# Altium integrated library Transistor-SMD_V2.IntLib: 415 symbols (part 2 of 2) (continued)
## NTGS4141N _TSOP6-X (continued)

## NTHD4508N_ChipFET8
designator Q?, comment NTHD4508N
FET Dual N-Channel 4.1A 20V; Manufacturer: On Semi; Package: ChipFET-8-1.7x3; EDM-PN: *; Text2: *; Text1: *; Value: NTHD4508N; SAAB PN: *; Part Number: NTHD4508N; DCE Part No: *
footprint ChipFET-8-1.7x3 (ChipFET 8 1.7x3.0mm)
part A pins: 1 S1, 2 G1, 7 D1, 8 D2
part B pins: 3 S2, 4 G2, 5 D2, 6 D2
part A text: D; G; S
part B text: D; G; S

## NTJD4152PT1G_SC88
designator Q?, comment NTJD4152PT1G
FET Dual P-Channel 0.88A 20V; Manufacturer: On Semi; Package: SC88-6; EDM-PN: *; Text2: *; Text1: *; Value: NTJD4152PT1G; SAAB PN: *; Part Number: NTJD4152PT1G; DCE Part No: *
footprint SC88-6 (SC88-6 1.35x2.2mm 6lead)
part A pins: 1 S1, 2 G1, 6 D1
part B pins: 3 D2, 4 S2, 5 G2
part A text: D; G; S
part B text: D; G; S

## NTLUS3A40PZ_UDFN6
designator Q?, comment NTLUS3A40PZ
FET P-Channel 9.4A 20V; Manufacturer: On Semi; Package: SO8; EDM-PN: *; Text2: *; Text1: *; Value: NTLUS3A40PZ; SAAB PN: *; Part Number: NTLUS3A40PZ; DCE Part No: *
footprint UDFN6-2x2-2EP (UDFN 6 2x2mm)
pins: 1 D, 2 D, 3 G, 4 S, 5 D, 6 D, 7 D, 8 S

## NTR4003NT1G_SOT23
designator Q?, comment NTR4003NT1G
FET N-Channel 500mA 30V; Manufacturer: On Semi; Package: SOT23; EDM-PN: *; Text2: *; Text1: *; Value: NTR4003NT1G; SAAB PN: *; Part Number: NTR4003NT1G; DCE Part No: *
footprint SOT23 (SOT23, 3-Leads, Body 3.0x1.4mm (max), Pitch 0.95mm, IPC Medium Density)
pins: 1 G, 2 S, 3 D

## NTR4003NT3G_SOT23
designator Q?, comment NTR4003NT3G
FET N-Channel 500mA 30V; Manufacturer: On Semi; Package: SOT23; EDM-PN: *; Text2: *; Text1: *; Value: NTR4003NT3G; SAAB PN: *; Part Number: NTR4003NT3G; DCE Part No: *
footprint SOT23 (SOT23, 3-Leads, Body 3.0x1.4mm (max), Pitch 0.95mm, IPC Medium Density)
pins: 1 G, 2 S, 3 D

## NTR5105PT1G_SOT23
designator Q?, comment NTR5105PT1G
FET P-Channel 60V 196mA; Manufacturer: On Semi; Package: SOT23; EDM-PN: *; Text2: *; Text1: *; Value: NTR5105PT1G; SAAB PN: *; DCE Part No: *; Part Number: NTR5105PT1G
footprint SOT23 (SOT23, 3-Leads, Body 3.0x1.4mm (max), Pitch 0.95mm, IPC Medium Density)
pins: 1 G, 2 S, 3 D

## NVTJD4001NT1G_SC70-6
designator Q?, comment NVTJD4001NT1G
FET N-Channel Dual  30V 250mA; Manufacturer: On Semi; Package: SC70-6; EDM-PN: *; Text2: *; Text1: *; Value: NVTJD4001NT1G; SAAB PN: *; DCE Part No: *; Part Number: NVTJD4001NT1G
footprint SC70-6 (SC70, 6-Leads, Body 2.2x1.4mm (max), Pitch 0.65mm, IPC Medium Density)
part A pins: 1 G, 2 S, 6 D
part B pins: 3 D, 4 S, 5 G

## NX2301P_SOT23
designator Q?, comment NX2301P
FET P-Channel 2A 20V; Manufacturer: NXP; Package: SOT23; EDM-PN: *; Text2: *; Text1: *; Value: NX2301P; SAAB PN: *; Part Number: NX2301P; DCE Part No: *
footprint SOT23 (SOT23, 3-Leads, Body 3.0x1.4mm (max), Pitch 0.95mm, IPC Medium Density)
pins: 1 G, 2 S, 3 D

## NX3008NBK_SOT23
designator Q?, comment NX3008NBK
FET N-Channel 400mA 30V Trench MOSFET; Manufacturer: NXP; Package: SOT23; EDM-PN: *; Text2: *; Text1: *; Value: NX3008NBK; Part Number: NX3008NBK; SAAB PN: *; DCE Part No: *
footprint SOT23 (SOT23, 3-Leads, Body 3.0x1.4mm (max), Pitch 0.95mm, IPC Medium Density)
pins: 1 G, 2 S, 3 D

## NYC0102BLT1G_SOT23_H
designator SCR?, comment NYC0102BLT1G
SCR 0.25Amp 200V; Manufacturer: Littelfuse; Package: SOT23; EDM-PN: *; Text2: *; Text1: *; Part Number: NYC0102BLT1G; SAAB PN: *; Value: NYC0102BLT1G; DCE Part No: *
footprint SOT23 (SOT23, 3-Leads, Body 3.0x1.4mm (max), Pitch 0.95mm, IPC Medium Density)
pins: 1 K, 2 G, 3 A

## NYC0102BLT1G_SOT23_V
designator SCR?, comment NYC0102BLT1G
SCR 0.25Amp 200V; Manufacturer: Littelfuse; Package: SOT23; EDM-PN: *; Text2: *; Text1: *; Part Number: NYC0102BLT1G; Value: NYC0102BLT1G; SAAB PN: *; DCE Part No: *
footprint SOT23 (SOT23, 3-Leads, Body 3.0x1.4mm (max), Pitch 0.95mm, IPC Medium Density)
pins: 1 K, 2 G, 3 A

## P0102BL 5AA4_SOT23_H
designator SCR?, comment value P0102BL  (hidden comment: P0102BL 5AA4)
SCR 0.25Amp 200V; Manufacturer: ST; Package: SOT23; EDM-PN: *; Text2: *; Text1: *; Part Number: P0102BL 5AA4; SAAB PN: *; DCE Part No: *
footprint SOT23 (SOT23, 3-Leads, Body 3.0x1.4mm (max), Pitch 0.95mm, IPC Medium Density)
pins: 1 K, 2 G, 3 A

## P0102BL 5AA4_SOT23_V
designator SCR?, comment value P0102BL  (hidden comment: P0102BL 5AA4)
SCR 0.25Amp 200V; Manufacturer: ST; Package: SOT23; EDM-PN: *; Text2: *; Text1: *; Part Number: P0102BL 5AA4; SAAB PN: *; DCE Part No: *
footprint SOT23 (SOT23, 3-Leads, Body 3.0x1.4mm (max), Pitch 0.95mm, IPC Medium Density)
pins: 1 K, 2 G, 3 A

## PBHV8560Z_SOT223
designator Q?, comment PBHV8560Z
Transistor NPN 600V 0.5A; Manufacturer: NXP; Package: SOT223; EDM-PN: *; Text2: *; Text1: *; Value: PBHV8560Z; SAAB PN: *; Part Number: PBHV8560Z; DCE Part No: *
footprint SOT223 (SOT223, 4-Leads, Body 6.7x7.3mm (max), Pitch 2.30mm, IPC Medium Density)
pins: 1 B, 2 C, 3 E, 4 C

## PBHV9050Z_SOT223
designator Q?, comment PBHV9050Z
Transistor PNP High Voltage 250mA 500V; Manufacturer: NXP; Package: SOT223; Text2: *; Text1: *; Value: PBHV9050Z; Part Number: PBHV9050Z; SAAB PN: *; DCE Part No: *
footprint SOT223 (SOT223, 4-Leads, Body 6.7x7.3mm (max), Pitch 2.30mm, IPC Medium Density)
pins: 1 G, 2 D, 3 S, 4 D
text: C; B; E

## PBHV9560Z_SOT223
designator Q?, comment PBHV9560Z
Transistor PNP High Voltage 600V 0.5A; Manufacturer: Nexperia; Package: SOT223; Text2: *; Text1: *; Value: PBHV9560Z; SAAB PN: *; Part Number: PBHV9560Z; DCE Part No: *
footprint SOT223 (SOT223, 4-Leads, Body 6.7x7.3mm (max), Pitch 2.30mm, IPC Medium Density)
pins: 1 G, 2 D, 3 S, 4 D
text: C; B; E

## PBHV9560ZX_SOT223
designator Q?, comment PBHV9560ZX
Transistor PNP High Voltage 600V 0.5A; Manufacturer: Nexperia; Package: SOT223; Text2: *; Text1: *; Value: PBHV9560ZX; SAAB PN: *; Part Number: PBHV9560ZX; DCE Part No: *
footprint SOT223 (SOT223, 4-Leads, Body 6.7x7.3mm (max), Pitch 2.30mm, IPC Medium Density)
pins: 1 G, 2 D, 3 S, 4 D
text: C; B; E

## PBSS8110T_SOT23-3N
designator Q?, comment PBSS8110T
Transistor NPN 1A 100V; Manufacturer: NXP; Reutech PN: 5961-NP-0059; Package: SOT23; EDM-PN: *; Text2: *; Text1: *; Value: PBSS8110T; SAAB PN: *; Part Number: PBSS8110T; DCE Part No: *
footprint SOT23 (SOT23, 3-Leads, Body 3.0x1.4mm (max), Pitch 0.95mm, IPC Medium Density)
pins: 1 B, 2 E, 3 C

## PD55003-E_PowerSO-10
designator Q?, comment PD55003-E
FET N-Channel RF Power Transistor; Manufacturer: ST; Package: SOT323; EDM-PN: *; Text2: *; Text1: *; Value: PD55003-E; SAAB PN: *; Part Number: PD55003-E; DCE Part No: *
footprint PowerSO-10RF-Formed (PowerSO-10RF Formed 15.4x9.5mm)
pins: 1 D, 2 S, 3 G

## PMBFJ177,215_SOT23
designator Q?, comment value PMBFJ177  (hidden comment: PMBFJ177,215)
FET P-Channel 50mA 20V; Manufacturer: NXP; Package: SOT23; EDM-PN: *; Text2: *; Text1: *; Part Number: PMBFJ177,215; SAAB PN: *; DCE Part No: *
footprint SOT23 (SOT23, 3-Leads, Body 3.0x1.4mm (max), Pitch 0.95mm, IPC Medium Density)
pins: 1 D, 2 S, 3 G

## PMBT2222_SOT23-3N
designator Q?, comment PMBT2222
Transistor NPN Switching; Manufacturer: Philips; Package: SOT23; EDM-PN: *; Text2: *; Text1: *; Value: PMBT2222; SAAB PN: *; Part Number: PMBT2222; DCE Part No: *
footprint SOT23 (SOT23, 3-Leads, Body 3.0x1.4mm (max), Pitch 0.95mm, IPC Medium Density)
pins: 1 B, 2 E, 3 C

## PMBT2222A_SOT23-3N
designator Q?, comment PMBT2222A
Transistor NPN Switching; Manufacturer: Philips; Package: SOT23; EDM-PN: *; Text2: *; Text1: *; Value: PMBT2222A; SAAB PN: *; Part Number: PMBT2222A; DCE Part No: *
footprint SOT23 (SOT23, 3-Leads, Body 3.0x1.4mm (max), Pitch 0.95mm, IPC Medium Density)
pins: 1 B, 2 E, 3 C

## PMBT2907A,215_SOT23
designator Q?, comment value PMBT2907A  (hidden comment: PMBT2907A,215)
Transistor PNP General Purpose 60V 600mA; Manufacturer: Nexperia; Package: SOT23; EDM-PN: *; Text2: *; Text1: *; SAAB PN: *; Part Number: PMBT2907A,215; DCE Part No: *
footprint SOT23 (SOT23, 3-Leads, Body 3.0x1.4mm (max), Pitch 0.95mm, IPC Medium Density)
pins: 1 B, 2 E, 3 C

## PMBT3904,215_SOT23
designator Q?, comment value PMBT3904  (hidden comment: PMBT3904,215)
Transistor NPN 40V 200mA; Manufacturer: Nexperia; Package: SOT23; EDM-PN: *; Text2: *; Text1: *; Part Number: PMBT3904,215; SAAB PN: *; DCE Part No: *
footprint SOT23 (SOT23, 3-Leads, Body 3.0x1.4mm (max), Pitch 0.95mm, IPC Medium Density)
pins: 1 B, 2 E, 3 C

## PMBTA45,215_SOT23
designator Q?, comment value PMBTA45  (hidden comment: PMBTA45,215PMBT3904,215)
Transistor NPN 500V 150mA; Manufacturer: Nexperia; Package: SOT23; EDM-PN: *; Text2: *; Text1: *; Part Number: PMBTA45,215; SAAB PN: *; DCE Part No: *
footprint SOT23 (SOT23, 3-Leads, Body 3.0x1.4mm (max), Pitch 0.95mm, IPC Medium Density)
pins: 1 B, 2 E, 3 C

## PMF280UN_SOT323
designator Q?, comment PMF280UN
FET N-Channel 1A 20V; Manufacturer: Philips; Package: SOT323; EDM-PN: *; Text2: *; Text1: *; Value: PMF280UN; SAAB PN: *; Part Number: PMF280UN; DCE Part No: *
footprint SOT323 (SOT323 2.2x1.3mm)
pins: 1 G, 2 S, 3 D

## PMF400UN_SOT323
designator Q?, comment PMF400UN
FET N-Channel 0.83A 30V; Manufacturer: Philips; Package: SOT323; EDM-PN: *; Text2: *; Text1: *; Value: PMF400UN; SAAB PN: *; Part Number: PMF400UN; DCE Part No: *
footprint SOT323 (SOT323 2.2x1.3mm)
pins: 1 G, 2 S, 3 D

## PMFPB8032XP,115_UDFN6
designator Q?, comment value PMFPB8032XP  (hidden comment: PMFPB8032XP,115)
FET P-Channel & Schottky Diode 20V 3.7A/320mA; Manufacturer: Nexperia; Package: DFN2020-6-EP2; EDM-PN: *; Text2: *; Text1: *; SAAB PN: *; Part Number: PMFPB8032XP,115; DCE Part No: *
footprint DFN2020-6-EP2 (DFN2020-6 2xE-PAD 2.0x2.0mm)
pins: 1 A, 2 NC, 3 D, 4 S, 5 G, 6 K, 7 K, 8 D

## PMGD780SN,115_SOT363
designator Q?, comment value PMGD780SN  (hidden comment: PMGD780SN,115)
FET Dual N-Channel 60V 490mA; Manufacturer: Nexperia; Package: SOT363-6; EDM-PN: *; Text2: *; Text1: *; Part Number: PMGD780SN,115; SAAB PN: *; DCE Part No: *
footprint SOT363-6 (SOT363 1.35x2.2mm 6lead)
part A pins: 1 S1, 2 G1, 6 D1
part B pins: 3 D2, 4 S2, 5 G2
part A text: D; G; S
part B text: D; G; S

## PMN22XN_TSOP6
designator Q?, comment PMN22XN
FET N-Channel 5.7A 30V; Manufacturer: NXP; Package: TSOP-6; EDM-PN: *; Text2: *; Text1: *; Value: PMN22XN; SAAB PN: *; Part Number: PMN22XN; DCE Part No: *
footprint TSOP-6 (SOT23, 6-Leads, Body 3.0x2.9mm (max), Pitch 0.95mm, IPC Medium Density)
pins: 1 D, 2 D, 3 G, 4 S, 5 D, 6 D

## PMN22XN_TSOP6-X
designator Q?, comment PMN22XN
FET N-Channel 5.7A 30V; Manufacturer: NXP; Package: TSOP-6; EDM-PN: *; Text2: *; Text1: *; Value: PMN22XN; SAAB PN: *; Part Number: PMN22XN; DCE Part No: *
footprint TSOP-6 (SOT23, 6-Leads, Body 3.0x2.9mm (max), Pitch 0.95mm, IPC Medium Density)
pins: 1 D, 2 D, 3 G, 4 S, 5 D, 6 D

## PMV65XP_SOT23
designator Q?, comment PMV65XP
FET P-Channel 3.9A 20V; Manufacturer: Philips; EDM-PN: FET35; Package: SOT23; Text2: *; Text1: *; Value: PMV65XP; SAAB PN: *; Part Number: PMV65XP; DCE Part No: *
footprint SOT23 (SOT23, 3-Leads, Body 3.0x1.4mm (max), Pitch 0.95mm, IPC Medium Density)
pins: 1 G, 2 S, 3 D

## PNP_BC856_SOT23-3N
designator Q?, comment BC856
Transistor PNP General Purpose Amplifier; Manufacturer: NXP; Package: SOT23; EDM-PN: *; Text2: *; Text1: *; Value: BC856; Part Number: BC856; SAAB PN: *; DCE Part No: *
footprint SOT23 (SOT23, 3-Leads, Body 3.0x1.4mm (max), Pitch 0.95mm, IPC Medium Density)
pins: 1 B, 2 E, 3 C

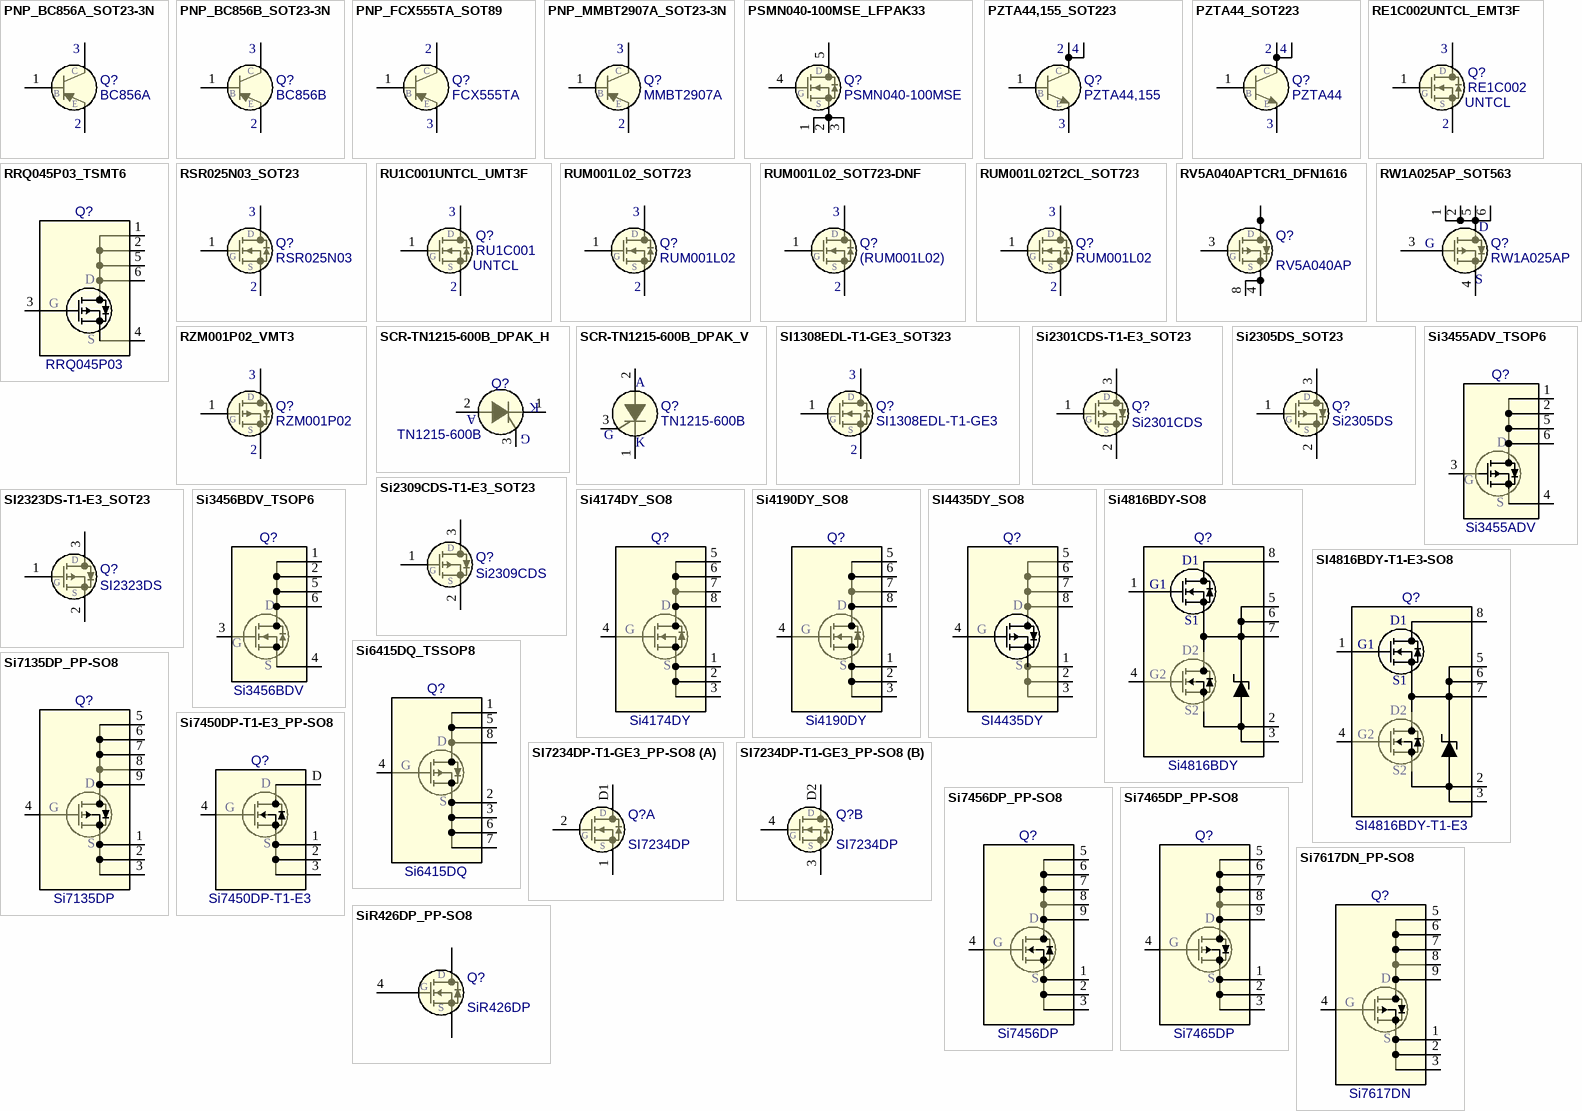
[diagram p9: symbols PNP_BC856A_SOT23-3N to SiR426DP_PP-SO8]

## PNP_BC856A_SOT23-3N
designator Q?, comment BC856A
Transistor PNP General Purpose Amplifier; Manufacturer: NXP; Package: SOT23; EDM-PN: *; Text2: *; Text1: *; Value: BC856A; Part Number: BC856A; SAAB PN: *; DCE Part No: *
footprint SOT23 (SOT23, 3-Leads, Body 3.0x1.4mm (max), Pitch 0.95mm, IPC Medium Density)
pins: 1 B, 2 E, 3 C

## PNP_BC856B_SOT23-3N
designator Q?, comment BC856B
Transistor PNP General Purpose Amplifier; Manufacturer: NXP; Package: SOT23; EDM-PN: *; Text2: *; Text1: *; Value: BC856B; Part Number: BC856B; SAAB PN: *; DCE Part No: *
footprint SOT23 (SOT23, 3-Leads, Body 3.0x1.4mm (max), Pitch 0.95mm, IPC Medium Density)
pins: 1 B, 2 E, 3 C

## PNP_FCX555TA_SOT89
designator Q?, comment FCX555TA
Transistor PNP High Voltage; Manufacturer: Zetex; Reutech PN: 5961-PN-0030; Package: SOT89; EDM-PN: *; Text2: *; Text1: *; Value: FCX555TA; Part Number: FCX555TA; SAAB PN: *; DCE Part No: *
footprint SOT89 (SOT89 4.5x2.45mm)
pins: 1 B, 2 C, 3 E

## PNP_MMBT2907A_SOT23-3N
designator Q?, comment MMBT2907A
Transistor PNP General Purpose Amplifier; Manufacturer: Motorola; Package: SOT23; EDM-PN: *; Text2: *; Text1: *; Value: MMBT2907A; SAAB PN: *; Part Number: MMBT2907A; DCE Part No: *
footprint SOT23 (SOT23, 3-Leads, Body 3.0x1.4mm (max), Pitch 0.95mm, IPC Medium Density)
pins: 1 B, 2 E, 3 C

## PSMN040-100MSE_LFPAK33
designator Q?, comment PSMN040-100MSE
FET N-Channel 100V 30A; Manufacturer: Nexperia; Package: LFPAK33; EDM-PN: *; Text2: *; Text1: *; Value: PSMN040-100MSE; SAAB PN: *; Part Number: PSMN040-100MSE; DCE Part No: *
footprint LFPAK33 (LFPAK33 2.6x2.4mm)
pins: 1 S, 2 S, 3 S, 4 G, 5 D

## PZTA44,155_SOT223
designator Q?, comment PZTA44,155
Transistor NPN 400V 0.3A; Manufacturer: Nexperia; Package: SOT223; EDM-PN: *; Text2: *; Text1: *; Value: PZTA44,155; SAAB PN: *; Part Number: PZTA44,155; DCE Part No: *
footprint SOT223 (SOT223, 4-Leads, Body 6.7x7.3mm (max), Pitch 2.30mm, IPC Medium Density)
pins: 1 B, 2 C, 3 E, 4 C

## PZTA44_SOT223
designator Q?, comment PZTA44
Transistor NPN 400V 0.3A; Manufacturer: NXP; Package: SOT223; EDM-PN: *; Text2: *; Text1: *; Value: PZTA44; SAAB PN: *; Part Number: PZTA44; DCE Part No: *
footprint SOT223 (SOT223, 4-Leads, Body 6.7x7.3mm (max), Pitch 2.30mm, IPC Medium Density)
pins: 1 B, 2 C, 3 E, 4 C

## RE1C002UNTCL_EMT3F
designator Q?, comment Text1: RE1C002  Text2: UNTCL  (hidden comment: RE1C002UNTCL)
FET N-Channel 20V 200mA; Manufacturer: ROHM; Package: EMT3F; EDM-PN: *; Value: RE1C002UNTCL; SAAB PN: *; Part Number: RE1C002UNTCL; DCE Part No: *
footprint EMT3F (EMT3F 1.7x0.96mm)
pins: 1 G, 2 S, 3 D

## RRQ045P03_TSMT6
designator Q?, comment RRQ045P03
FET P-Channel 4.5A 30V; Manufacturer: ROHM; Package: TSMT6; EDM-PN: *; Text2: *; Text1: *; Value: RRQ045P03; SAAB PN: *; Part Number: RRQ045P03; DCE Part No: *
footprint TSMT6 (TSMT6 1.6x2.9mm)
pins: 1 S, 2 S, 3 S, 4 G, 5 D, 6 D

## RSR025N03_SOT23
designator Q?, comment RSR025N03
FET N-Channel 2.5A 30V; Manufacturer: ROHM; Package: SOT23; EDM-PN: *; Text2: *; Text1: *; Value: RSR025N03; SAAB PN: *; Part Number: RSR025N03; DCE Part No: *
footprint SOT23 (SOT23, 3-Leads, Body 3.0x1.4mm (max), Pitch 0.95mm, IPC Medium Density)
pins: 1 G, 2 S, 3 D

## RU1C001UNTCL_UMT3F
designator Q?, comment Text1: RU1C001  Text2: UNTCL  (hidden comment: RU1C001UNTCL)
FET N-Channel 20V 100mA; Manufacturer: ROHM; Package: UMT3F; EDM-PN: *; Value: RU1C001UNTCL; SAAB PN: *; Part Number: RU1C001UNTCL; DCE Part No: *
footprint UMT3F (UMT3F 2.1x1.35mm)
pins: 1 G, 2 S, 3 D

## RUM001L02_SOT723
designator Q?, comment RUM001L02
FET N-Channel 20V 100mA; Manufacturer: ROHM; EDM-PN: FET187; Package: SOT723; Text2: *; Text1: *; Value: RUM001L02; SAAB PN: *; DCE Part No: *; Part Number: RUM001L02
footprint SOT723 (SOT723 1.2x0.8mm)
pins: 1 G, 2 S, 3 D

## RUM001L02_SOT723-DNF
designator Q?, comment value (RUM001L02)  (hidden comment: RUM001L02-DNF)
FET N-Channel 20V 100mA - Do not Fit; Manufacturer: ROHM; Part Number: DNF - RUM001L02; Package: SOT723; EDM-PN: *; Text2: *; Text1: *; SAAB PN: *; DCE Part No: *
footprint SOT723 (SOT723 1.2x0.8mm)
pins: 1 G, 2 S, 3 D

## RUM001L02T2CL_SOT723
designator Q?, comment value RUM001L02  (hidden comment: RUM001L02T2CL)
FET N-Channel 20V 100mA; Manufacturer: ROHM; DCE Part No: 9474; EDM-PN: FET187; Package: SOT723; Text2: *; Text1: *; SAAB PN: *; Part Number: RUM001L02T2CL
footprint SOT723 (SOT723 1.2x0.8mm)
pins: 1 G, 2 S, 3 D

## RV5A040APTCR1_DFN1616
designator Q?, comment value RV5A040AP  (hidden comment: RV5A040APTCR1)
FET P-Channel 12V 4A; Manufacturer: Rohm; DCE Part No: 10289; Package: DFN1616-8; EDM-PN: *; Text2: *; Text1: *; SAAB PN: *; Part Number: RV5A040APTCR1
footprint DFN1616-8 (DFN1616-8 1.6x1.6mm)
pins: 1 S, 2 S, 3 S, 4 G, 5 D, 6 D, 7 D, 8 D

## RW1A025AP_SOT563
designator Q?, comment RW1A025AP
FET P-Channel 2.5A 12V; Manufacturer: ROHM; DCE Part No: 9475; Package: SOT563-6; EDM-PN: *; Text2: *; Text1: *; Value: RW1A025AP; SAAB PN: *; Part Number: RW1A025AP
footprint SOT563-6 (SOT563-6 1.2x1.6mm)
pins: 1 S, 2 S, 3 S, 4 G, 5 D, 6 D

## RZM001P02_VMT3
designator Q?, comment RZM001P02
FET P-Channel 100mA 20V; Manufacturer: ROHM; Package: VMT3-1.3x0.9; EDM-PN: *; Text2: *; Text1: *; Value: RZM001P02; SAAB PN: *; DCE Part No: *; Part Number: RZM001P02
footprint VMT3-1.3x0.9 (VMT3 1.3x0.9mm)
pins: 1 G, 2 S, 3 D

## SCR-TN1215-600B_DPAK_H
designator Q?, comment TN1215-600B
SCR 12Amp; Manufacturer: ST; Package: D-PAK; EDM-PN: *; Text2: *; Text1: *; Value: TN1215-600B; SAAB PN: *; DCE Part No: *; Part Number: TN1215-600B
footprint D-PAK (D-Pak 6.73x6.22mm)
pins: 1 K, 2 A, 3 G

## SCR-TN1215-600B_DPAK_V
designator Q?, comment TN1215-600B
SCR 12Amp; Manufacturer: ST; Package: D-PAK; EDM-PN: *; Text2: *; Text1: *; Value: TN1215-600B; Part Number: TN1215-600B; SAAB PN: *; DCE Part No: *
footprint D-PAK (D-Pak 6.73x6.22mm)
pins: 1 K, 2 A, 3 G

## SI1308EDL-T1-GE3_SOT323
designator Q?, comment SI1308EDL-T1-GE3
FET N-Channel 1.4A 30V; Manufacturer: Vishay; Package: SOT323; EDM-PN: *; Text2: *; Text1: *; Value: SI1308EDL-T1-GE3; SAAB PN: *; DCE Part No: *; Part Number: SI1308EDL-T1-GE3
footprint SOT323 (SOT323 2.2x1.3mm)
pins: 1 G, 2 S, 3 D

## Si2301CDS-T1-E3_SOT23
designator Q?, comment value Si2301CDS  (hidden comment: Si2301CDS-T1-E3)
FET P-Channel 3.1A 20V; Manufacturer: Vishay; Package: SOT23; EDM-PN: *; Text2: *; Text1: *; Part Number: Si2301CDS-T1-E3; SAAB PN: *; DCE Part No: *
footprint SOT23 (SOT23, 3-Leads, Body 3.0x1.4mm (max), Pitch 0.95mm, IPC Medium Density)
pins: 1 G, 2 S, 3 D

## Si2305DS_SOT23
designator Q?, comment Si2305DS
FET P-Channel 3.5A 8V; Manufacturer: Vishay; Package: SOT23; EDM-PN: *; Text2: *; Text1: *; Value: Si2305DS; SAAB PN: *; Part Number: Si2305DS; DCE Part No: *
footprint SOT23 (SOT23, 3-Leads, Body 3.0x1.4mm (max), Pitch 0.95mm, IPC Medium Density)
pins: 1 G, 2 S, 3 D

## Si2309CDS-T1-E3_SOT23
designator Q?, comment value Si2309CDS  (hidden comment: Si2309CDS-T1-E3)
FET P-Channel 1.6A 60V; Manufacturer: Vishay; Package: SOT23; EDM-PN: *; Text2: *; Text1: *; Part Number: Si2309CDS-T1-E3; SAAB PN: *; DCE Part No: *
footprint SOT23 (SOT23, 3-Leads, Body 3.0x1.4mm (max), Pitch 0.95mm, IPC Medium Density)
pins: 1 G, 2 S, 3 D

## SI2323DS-T1-E3_SOT23
designator Q?, comment value SI2323DS  (hidden comment: SI2323DS-T1-E3)
FET P-Channel 20V 3.7A; Manufacturer: Vishay; Package: SOT23; EDM-PN: *; Text2: *; Text1: *; Part Number: SI2323DS-T1-E3; SAAB PN: *; DCE Part No: *
footprint SOT23 (SOT23, 3-Leads, Body 3.0x1.4mm (max), Pitch 0.95mm, IPC Medium Density)
pins: 1 G, 2 S, 3 D

## Si3455ADV_TSOP6
designator Q?, comment Si3455ADV
FET P-Channel 2.7A 30V; Manufacturer: Vishay; Package: TSOP-6; EDM-PN: *; Text2: *; Text1: *; Value: Si3455ADV; SAAB PN: *; Part Number: Si3455ADV; DCE Part No: *
footprint TSOP-6 (SOT23, 6-Leads, Body 3.0x2.9mm (max), Pitch 0.95mm, IPC Medium Density)
pins: 1 D, 2 D, 3 G, 4 S, 5 D, 6 D

## Si3456BDV_TSOP6
designator Q?, comment Si3456BDV
FET N-Channel 6A 30V; Manufacturer: Vishay; Package: TSOP-6; EDM-PN: *; Text2: *; Text1: *; Value: Si3456BDV; SAAB PN: *; Part Number: Si3456BDV; DCE Part No: *
footprint TSOP-6 (SOT23, 6-Leads, Body 3.0x2.9mm (max), Pitch 0.95mm, IPC Medium Density)
pins: 1 D, 2 D, 3 G, 4 S, 5 D, 6 D

## Si4174DY_SO8
designator Q?, comment Si4174DY
FET N-Channel 17A 30V; Manufacturer: Vishay; Package: SO8; EDM-PN: *; Text2: *; Text1: *; Value: Si4174DY; SAAB PN: *; Part Number: Si4174DY; DCE Part No: *
footprint SO8 (SOIC, 8-Leads, Body 5.0x4.0mm (max), Pitch 1.27mm, IPC Medium Density)
pins: 1 S, 2 S, 3 S, 4 G, 5 D, 6 D, 7 D, 8 D

## Si4190DY_SO8
designator Q?, comment Si4190DY
FET N-Channel 7.5A 150V; Manufacturer: Vishay; Package: SO8; EDM-PN: *; Text2: *; Text1: *; Value: Si4190DY; SAAB PN: *; Part Number: Si4190DY; DCE Part No: *
footprint SO8 (SOIC, 8-Leads, Body 5.0x4.0mm (max), Pitch 1.27mm, IPC Medium Density)
pins: 1 S, 2 S, 3 S, 4 G, 5 D, 6 D, 7 D, 8 D

## SI4435DY_SO8
designator Q?, comment SI4435DY
FET P-Channel 6A 30V; Manufacturer: Vishay; Package: SO8; EDM-PN: *; Text2: *; Text1: *; Value: SI4435DY; SAAB PN: *; Part Number: SI4435DY; DCE Part No: *
footprint SO8 (SOIC, 8-Leads, Body 5.0x4.0mm (max), Pitch 1.27mm, IPC Medium Density)
pins: 1 S, 2 S, 3 S, 4 G, 5 D, 6 D, 7 D, 8 D

## Si4816BDY-SO8
designator Q?, comment Si4816BDY
FET Dual N-Channel 30V 5.8/8.2A with Diode; Manufacturer: Vishay; Package: SO8; EDM-PN: *; Text2: *; Text1: *; Value: Si4816BDY; SAAB PN: *; Part Number: Si4816BDY; DCE Part No: *
footprint SO8 (SOIC, 8-Leads, Body 5.0x4.0mm (max), Pitch 1.27mm, IPC Medium Density)
pins: 1 G1, 2 A/S2, 3 A/S2, 4 G2, 5 D2/S1, 6 D2/S1, 7 D2/S1, 8 D1
text: S1; D2; S2

## SI4816BDY-T1-E3-SO8
designator Q?, comment SI4816BDY-T1-E3
FET Dual N-Channel 30V 5.8/8.2A with Diode; Manufacturer: Vishay; Package: SO8; EDM-PN: *; Text2: *; Text1: *; Value: SI4816BDY-T1-E3; SAAB PN: *; Part Number: SI4816BDY-T1-E3; DCE Part No: *
footprint SO8 (SOIC, 8-Leads, Body 5.0x4.0mm (max), Pitch 1.27mm, IPC Medium Density)
pins: 1 G1, 2 A/S2, 3 A/S2, 4 G2, 5 D2/S1, 6 D2/S1, 7 D2/S1, 8 D1
text: S1; D2; S2

## Si6415DQ_TSSOP8
designator Q?, comment Si6415DQ
FET P-Channel 6.5A 30V; Manufacturer: Vishay; Package: TSSOP-8; EDM-PN: *; Text2: *; Text1: *; Value: Si6415DQ; SAAB PN: *; Part Number: Si6415DQ; DCE Part No: *
footprint TSSOP8-3.1x4.5 (TSSOP, 8-Leads, Body 3.1x4.5mm (max), Pitch 0.65mm, IPC Medium Density)
pins: 1 D, 2 S, 3 S, 4 G, 5 D, 6 S, 7 S, 8 D

## Si7135DP_PP-SO8
designator Q?, comment Si7135DP
FET P-Channel 31A 30V; Manufacturer: Vishay; Package: P-PAK-SO8-6.1x5.1; EDM-PN: *; Text2: *; Text1: *; Value: Si7135DP; SAAB PN: *; Part Number: Si7135DP; DCE Part No: *
footprint P-PAK-SO8-6.1x5.1 (P-PAK-SO8 6.1x5.1mm)
pins: 1 S, 2 S, 3 S, 4 G, 5 D, 6 D, 7 D, 8 D, 9 D

## SI7234DP-T1-GE3_PP-SO8
designator Q?, comment value SI7234DP  (hidden comment: SI7234DP-T1-GE3)
FET Dual N-Channel 60A 12V; Manufacturer: Vishay; Package: P-PAK-SO8-6.1x5.1-DUAL; EDM-PN: *; Text2: *; Text1: *; SAAB PN: *; Part Number: SI7234DP-T1-GE3; DCE Part No: *
footprint P-PAK-SO8-6.1x5.1-DUAL (P-PAK-SO8 DUAL 6.1x5.1mm)
part A pins: 1 S1, 2 G1, D1
part B pins: 3 S2, 4 G2, D2
part A text: D; G; S
part B text: D; G; S

## Si7450DP-T1-E3_PP-SO8
designator Q?, comment Si7450DP-T1-E3
FET N-Channel 5A 200V; Manufacturer: Vishay; Package: P-PAK-SO8-6.1x5.1-SINGLE; EDM-PN: *; Text2: *; Text1: *; Value: Si7450DP-T1-E3; SAAB PN: *; Part Number: Si7450DP-T1-E3; DCE Part No: *
footprint P-PAK-SO8-6.1x5.1-SINGLE (P-PAK-SO8 6.1x5.1mm)
pins: 1 S, 2 S, 3 S, 4 G, D

## Si7456DP_PP-SO8
designator Q?, comment Si7456DP
FET N-Channel 9A 100V; Manufacturer: Vishay; Package: P-PAK-SO8-6.1x5.1; EDM-PN: *; Text2: *; Text1: *; Value: Si7456DP; SAAB PN: *; Part Number: Si7456DP; DCE Part No: *
footprint P-PAK-SO8-6.1x5.1 (P-PAK-SO8 6.1x5.1mm)
pins: 1 S, 2 S, 3 S, 4 G, 5 D, 6 D, 7 D, 8 D, 9 D

## Si7465DP_PP-SO8
designator Q?, comment Si7465DP
FET P-Channel 5A 60V; Manufacturer: Vishay; Package: P-PAK-SO8-6.1x5.1; EDM-PN: *; Text2: *; Text1: *; Value: Si7465DP; SAAB PN: *; Part Number: Si7465DP; DCE Part No: *
footprint P-PAK-SO8-6.1x5.1 (P-PAK-SO8 6.1x5.1mm)
pins: 1 S, 2 S, 3 S, 4 G, 5 D, 6 D, 7 D, 8 D, 9 D

## Si7617DN_PP-SO8
designator Q?, comment Si7617DN
FET P-Channel 35A 30V; Manufacturer: Vishay; Package: P-PAK-SO8-3.3x3.3; EDM-PN: *; Text2: *; Text1: *; Value: Si7617DN; SAAB PN: *; Part Number: Si7617DN; DCE Part No: *
footprint P-PAK-SO8-3.3x3.3 (P-Pak 8  3.3x3.3mm)
pins: 1 S, 2 S, 3 S, 4 G, 5 D, 6 D, 7 D, 8 D, 9 D

## SiR426DP_PP-SO8
designator Q?, comment SiR426DP
FET N-Channel 40V 30A; Manufacturer: Vishay; Package: P-PAK-SO8-6.1x5.1-SINGLE; EDM-PN: *; Text2: *; Text1: *; Value: SiR426DP; SAAB PN: *; Part Number: SiR426DP; DCE Part No: *
footprint P-PAK-SO8-6.1x5.1-SINGLE (P-PAK-SO8 6.1x5.1mm)
pins: 1 S, 2 S, 3 S, 4 G, D

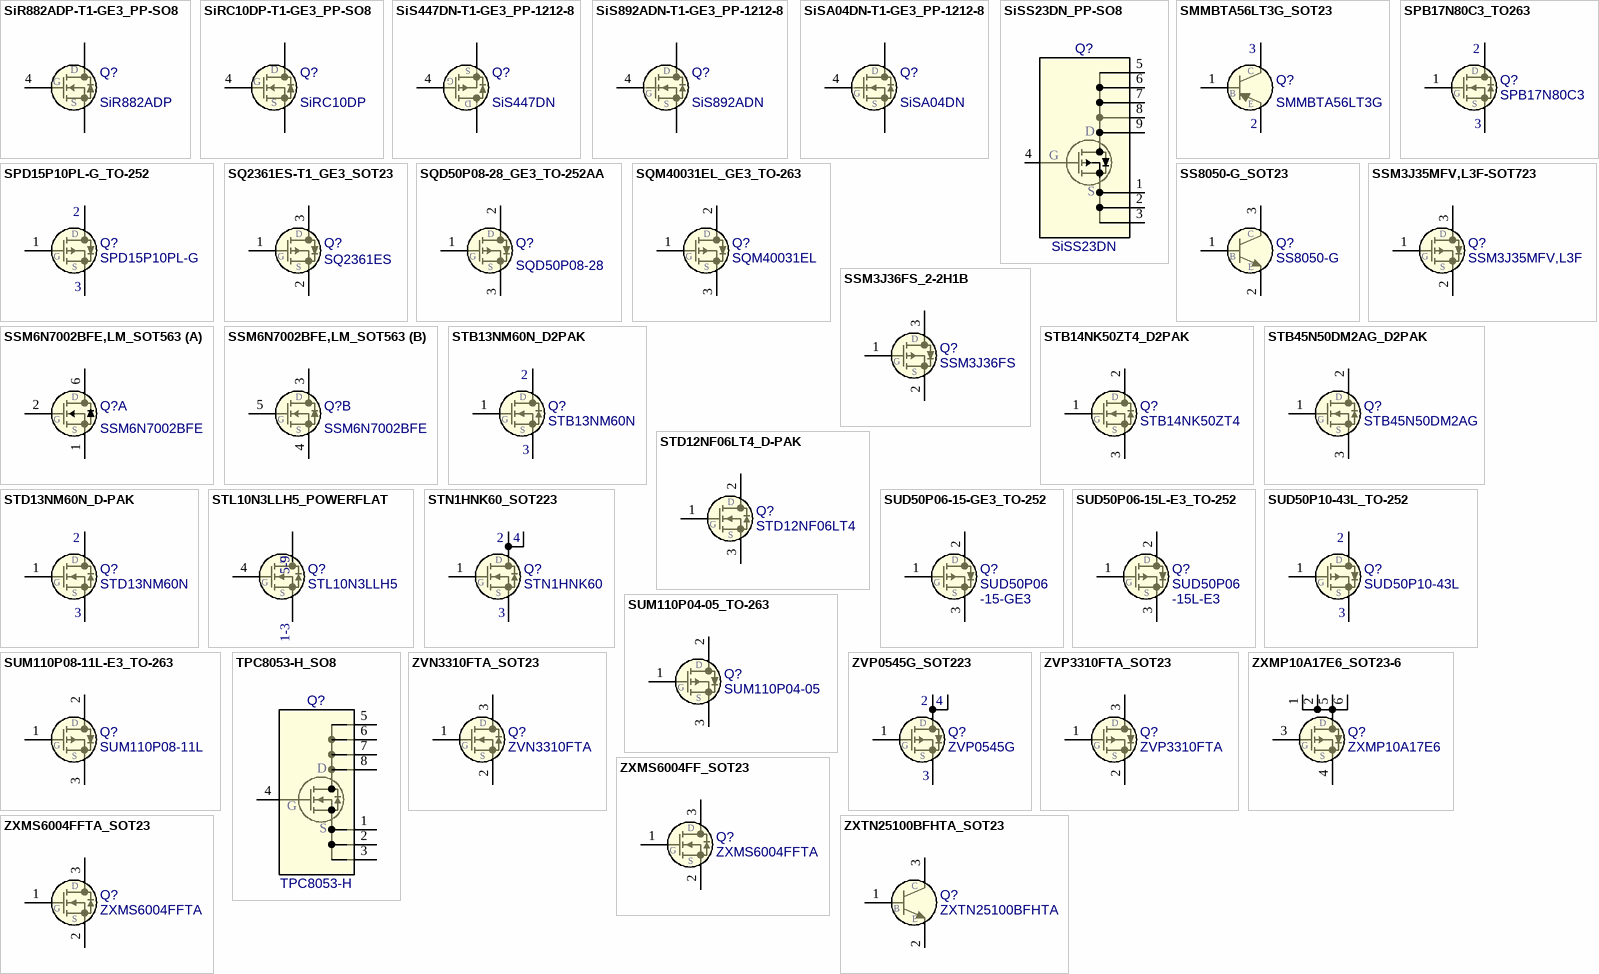
[diagram p10: symbols SiR882ADP-T1-GE3_PP-SO8 to ZXTN25100BFHTA_SOT23]

## SiR882ADP-T1-GE3_PP-SO8
designator Q?, comment value SiR882ADP  (hidden comment: SiR882ADP-T1-GE3)
FET N-Channel 40V 30V; Manufacturer: Vishay; Package: P-PAK-SO8-6.1x5.1-SINGLE; EDM-PN: *; Text2: *; Text1: *; SAAB PN: *; Part Number: SiR882ADP-T1-GE3; DCE Part No: *
footprint P-PAK-SO8-6.1x5.1-SINGLE (P-PAK-SO8 6.1x5.1mm)
pins: 1 S, 2 S, 3 S, 4 G, D

## SiRC10DP-T1-GE3_PP-SO8
designator Q?, comment value SiRC10DP  (hidden comment: SiRC10DP-T1-GE3)
FET N-Channel 30V 60A; Manufacturer: Vishay; Package: P-PAK-SO8-6.1x5.1-SINGLE; EDM-PN: *; Text2: *; Text1: *; SAAB PN: *; Part Number: SiRC10DP-T1-GE3; DCE Part No: *
footprint P-PAK-SO8-6.1x5.1-SINGLE (P-PAK-SO8 6.1x5.1mm)
pins: 1 S, 2 S, 3 S, 4 G, D

## SiS447DN-T1-GE3_PP-1212-8
designator Q?, comment value SiS447DN  (hidden comment: SiS447DN-T1-GE3)
FET P-Channel 20V 18A; Manufacturer: Vishay; EDM-PN: FET198; Package: P-PAK-SO8-6.1x5.1; Text2: *; Text1: *; SAAB PN: *; Part Number: SiS447DN-T1-GE3; DCE Part No: *
footprint POWER-PAK-1212-8-S (POWER-PAK-1212-8 3.2x3.2mm)
pins: 1 S, 2 S, 3 S, 4 G, 5 D, 6 D, 7 D, 8 D, 9 D

## SiS892ADN-T1-GE3_PP-1212-8
designator Q?, comment value SiS892ADN  (hidden comment: SiS892ADN-T1-GE3)
FET N-Channel 40A 30V; Manufacturer: Vishay; Package: P-PAK-SO8-6.1x5.1; EDM-PN: *; Text2: *; Text1: *; SAAB PN: *; Part Number: SiS892ADN-T1-GE3; DCE Part No: *
footprint POWER-PAK-1212-8-S (POWER-PAK-1212-8 3.2x3.2mm)
pins: 1 S, 2 S, 3 S, 4 G, 5 D, 6 D, 7 D, 8 D, 9 D

## SiSA04DN-T1-GE3_PP-1212-8
designator Q?, comment value SiSA04DN  (hidden comment: SiSA04DN-T1-GE3)
FET N-Channel 40A 30V; Manufacturer: Vishay; Package: P-PAK-SO8-6.1x5.1; EDM-PN: *; Text2: *; Text1: *; SAAB PN: *; Part Number: SiSA04DN-T1-GE3; DCE Part No: *
footprint POWER-PAK-1212-8-S (POWER-PAK-1212-8 3.2x3.2mm)
pins: 1 S, 2 S, 3 S, 4 G, 5 D, 6 D, 7 D, 8 D, 9 D

## SiSS23DN_PP-SO8
designator Q?, comment SiSS23DN
FET P-Channel 21A 20V; Manufacturer: Vishay; Package: P-PAK-SO8-3.3x3.3; EDM-PN: *; Text2: *; Text1: *; Value: SiSS23DN; SAAB PN: *; Part Number: SiSS23DN; DCE Part No: *
footprint P-PAK-SO8-3.3x3.3 (P-Pak 8  3.3x3.3mm)
pins: 1 S, 2 S, 3 S, 4 G, 5 D, 6 D, 7 D, 8 D, 9 D

## SMMBTA56LT3G_SOT23
designator Q?, comment SMMBTA56LT3G
Transistor PNP 80V 500mA Auto; Manufacturer: On Semi; Reutech PN: 5961-TR-0052; Package: SOT23; EDM-PN: *; Text2: *; Text1: *; SAAB PN: *; Part Number: SMMBTA56LT3G; Value: SMMBTA56LT3G; DCE Part No: *
footprint SOT23 (SOT23, 3-Leads, Body 3.0x1.4mm (max), Pitch 0.95mm, IPC Medium Density)
pins: 1 B, 2 E, 3 C

## SPB17N80C3_TO263
designator Q?, comment SPB17N80C3
FET N-Channel 17A 800V CoolMOS Power; Manufacturer: Infineon; Package: TO-263; EDM-PN: *; Text2: *; Text1: *; Value: SPB17N80C3; SAAB PN: *; Part Number: SPB17N80C3; DCE Part No: *
footprint TO-263 (TO-263, 3-Pads, Body 9.4x10.4mm (max), IPC Medium Density)
pins: 1 G, 2 D, 3 S

## SPD15P10PL-G_TO-252
designator Q?, comment SPD15P10PL-G
FET SIPMOS Power-Transistor 15A 100V; Manufacturer: Infineon; Package: TO-252; EDM-PN: *; Text2: *; Text1: *; Value: SPD15P10PL-G; SAAB PN: *; Part Number: SPD15P10PL-G; DCE Part No: *
footprint TO-252 (TO-252 6.58x6.1mm)
pins: 1 G, 2 D, 3 S

## SQ2361ES-T1_GE3_SOT23
designator Q?, comment value SQ2361ES  (hidden comment: SQ2361ES-T1_GE3)
FET P-Channel 60V 2.8A; Manufacturer: Vishay; Reutech PN: 5961-FE-0106; Package: SOT23; EDM-PN: *; Text2: *; Text1: *; Part Number: SQ2361ES-T1_GE3; SAAB PN: *; DCE Part No: *
footprint SOT23 (SOT23, 3-Leads, Body 3.0x1.4mm (max), Pitch 0.95mm, IPC Medium Density)
pins: 1 G, 2 S, 3 D

## SQD50P08-28_GE3_TO-252AA
designator Q?, comment value SQD50P08-28  (hidden comment: SQD50P08-28_GE3)
FET P-Channel 80V 48A AEC-Q101; Manufacturer: Vishay; Reutech PN: 5961-FE-0110; Package: TO-252AA; EDM-PN: *; Text2: *; Text1: *; SAAB PN: *; Part Number: SQD50P08-28_GE3; DCE Part No: *
footprint TO-252AA (TO-252AA 6.73x6.22mm)
pins: 1 G, 2 D, 3 S

## SQM40031EL_GE3_TO-263
designator Q?, comment value SQM40031EL  (hidden comment: SQM40031EL_GE3)
FET P-Channel 40V 120A; Manufacturer: Vishay; EDM-PN: FET168; Package: TO-263; Text2: *; Text1: *; SAAB PN: *; Part Number: SQM40031EL_GE3; DCE Part No: *
footprint TO-263 (TO-263, 3-Pads, Body 9.4x10.4mm (max), IPC Medium Density)
pins: 1 G, 2 D, 3 S

## SS8050-G_SOT23
designator Q?, comment SS8050-G
Transistor NPN 40V 1.5A; Manufacturer: Comchip Tech; EDM-PN: TRN135; Package: SOT23; Text2: *; Text1: *; Part Number: SS8050-G; SAAB PN: *; Value: SS8050-G; DCE Part No: *
footprint SOT23 (SOT23, 3-Leads, Body 3.0x1.4mm (max), Pitch 0.95mm, IPC Medium Density)
pins: 1 B, 2 E, 3 C

## SSM3J35MFV,L3F-SOT723
designator Q?, comment SSM3J35MFV,L3F
FET P-Channel 20V 100mA; Manufacturer: Toshiba; Package: SOT723; EDM-PN: *; Text2: *; Text1: *; Value: SSM3J35MFV,L3F; SAAB PN: *; Part Number: SSM3J35MFV,L3F; DCE Part No: *
footprint SOT723 (SOT723 1.2x0.8mm)
pins: 1 G, 2 S, 3 D

## SSM3J36FS_2-2H1B
designator Q?, comment SSM3J36FS
FET P-Channel 330mA 20V; Manufacturer: Toshiba; Package: 2-2H1B; EDM-PN: *; Text2: *; Text1: *; Value: SSM3J36FS; SAAB PN: *; Part Number: SSM3J36FS; DCE Part No: *
footprint 2-2H1B (2-2H1B 1.6x0.8mm)
pins: 1 G, 2 S, 3 D

## SSM6N7002BFE,LM_SOT563
designator Q?, comment value SSM6N7002BFE  (hidden comment: SSM6N7002BFE,LM)
FET Dual N-Channel 200mA 60V; Manufacturer: Toshiba; Package: SOT563-6; EDM-PN: *; Text2: *; Text1: *; Part Number: SSM6N7002BFE,LM; SAAB PN: *; DCE Part No: *
footprint SOT563-6 (SOT563-6 1.2x1.6mm)
part A pins: 1 S1, 2 G1, 6 D1
part B pins: 3 D2, 4 S2, 5 G2
part A text: D; G; S
part B text: D; G; S

## STB13NM60N_D2PAK
designator Q?, comment STB13NM60N
FET N-Channel 600V 11A; Manufacturer: ST; Package: D2PAK; EDM-PN: *; Text2: *; Text1: *; Value: STB13NM60N; SAAB PN: *; Part Number: STB13NM60N; DCE Part No: *
footprint D2PAK (D2-PAK, 3-Pads, Body 9.4x10.4mm (max), IPC Medium Density)
pins: 1 G, 2 D, 3 S

## STB14NK50ZT4_D2PAK
designator Q?, comment STB14NK50ZT4
FET N-Channel 500V 14A; Manufacturer: ST; Package: D2PAK; EDM-PN: *; Text2: *; Text1: *; Value: STB14NK50ZT4; SAAB PN: *; Part Number: STB14NK50ZT4; DCE Part No: *
footprint D2PAK (D2-PAK, 3-Pads, Body 9.4x10.4mm (max), IPC Medium Density)
pins: 1 G, 2 D, 3 S

## STB45N50DM2AG_D2PAK
designator Q?, comment STB45N50DM2AG
FET N-Channel 500V 35A; Manufacturer: ST; Package: D2PAK; EDM-PN: *; Text2: *; Text1: *; Value: STB45N50DM2AG; SAAB PN: *; Part Number: STB45N50DM2AG; DCE Part No: *
footprint D2PAK (D2-PAK, 3-Pads, Body 9.4x10.4mm (max), IPC Medium Density)
pins: 1 G, 2 D, 3 S

## STD12NF06LT4_D-PAK
designator Q?, comment STD12NF06LT4
FET N-Channel 60V 12A; Manufacturer: ST; Package: D-PAK-3; EDM-PN: *; Text2: *; Text1: *; Value: STD12NF06LT4; SAAB PN: *; Part Number: STD12NF06LT4; DCE Part No: *
footprint D-PAK-3 (D-Pak 6.73x6.22mm)
pins: 1 G, 2 D, 3 S

## STD13NM60N_D-PAK
designator Q?, comment STD13NM60N
FET N-Channel 600V 11A; Manufacturer: ST; Package: D-PAK-3; EDM-PN: *; Text2: *; Text1: *; Value: STD13NM60N; SAAB PN: *; Part Number: STD13NM60N; DCE Part No: *
footprint D-PAK-3 (D-Pak 6.73x6.22mm)
pins: 1 G, 2 D, 3 S

## STL10N3LLH5_POWERFLAT
designator Q?, comment STL10N3LLH5
FET N-Channel 30V 9A; Manufacturer: STM; Package: PowerFLAT-3.3x3.3-8L; EDM-PN: *; Text2: *; Text1: *; Value: STL10N3LLH5; SAAB PN: *; Part Number: STL10N3LLH5; DCE Part No: *
footprint PowerFLAT-3.3x3.3-8L (P-Pak 8  3.3x3.3mm)
pins: 1 S, 2 S, 3 S, 4 G, 5 D, 6 D, 7 D, 8 D, 9
text: 5-9; 1-3

## STN1HNK60_SOT223
designator Q?, comment STN1HNK60
FET N-Channel 600V 17A; Manufacturer: ST; Package: SOT223; EDM-PN: *; Text2: *; Text1: *; Value: STN1HNK60; SAAB PN: *; Part Number: STN1HNK60; DCE Part No: *
footprint SOT223 (SOT223, 4-Leads, Body 6.7x7.3mm (max), Pitch 2.30mm, IPC Medium Density)
pins: 1 G, 2 D, 3 S, 4 D

## SUD50P06-15-GE3_TO-252
designator Q?, comment Text2: -15-GE3  Text1: SUD50P06  (hidden comment: SUD50P06-15-GE3)
FET P-Channel 60V 50A; Manufacturer: Vishay; Package: TO-252; EDM-PN: *; Value: SUD50P06-15-GE3; Part Number: SUD50P06-15-GE3; SAAB PN: *; DCE Part No: *
footprint TO-252 (TO-252 6.58x6.1mm)
pins: 1 G, 2 D, 3 S

## SUD50P06-15L-E3_TO-252
designator Q?, comment Text2: -15L-E3  Text1: SUD50P06  (hidden comment: SUD50P06-15L-E3)
FET P-Channel 60V 50A; Manufacturer: Vishay; Package: TO-252; EDM-PN: *; Value: SUD50P06-15L-E3; Part Number: SUD50P06-15L-E3; SAAB PN: *; DCE Part No: *
footprint TO-252 (TO-252 6.58x6.1mm)
pins: 1 G, 2 D, 3 S

## SUD50P10-43L_TO-252
designator Q?, comment SUD50P10-43L
FET P-Channel 100V 35A; Manufacturer: Vishay; Package: TO-252; EDM-PN: *; Text2: *; Text1: *; Value: SUD50P10-43L; SAAB PN: *; Part Number: SUD50P10-43L; DCE Part No: *
footprint TO-252 (TO-252 6.58x6.1mm)
pins: 1 G, 2 D, 3 S

## SUM110P04-05_TO-263
designator Q?, comment SUM110P04-05
FET P-Channel 40V 110A; Manufacturer: Vishay; Package: TO-263; EDM-PN: *; Text2: *; Text1: *; Value: SUM110P04-05; SAAB PN: *; Part Number: SUM110P04-05; DCE Part No: *
footprint TO-263 (TO-263, 3-Pads, Body 9.4x10.4mm (max), IPC Medium Density)
pins: 1 G, 2 D, 3 S

## SUM110P08-11L-E3_TO-263
designator Q?, comment value SUM110P08-11L  (hidden comment: SUM110P08-11L-E3)
FET P-Channel 80V 110A; Manufacturer: Vishay; Reutech PN: 5961-CM-0094; Package: TO-263; EDM-PN: *; Text2: *; Text1: *; SAAB PN: *; Part Number: SUM110P08-11L-E3; DCE Part No: *
footprint TO-263 (TO-263, 3-Pads, Body 9.4x10.4mm (max), IPC Medium Density)
pins: 1 G, 2 D, 3 S

## TPC8053-H_SO8
designator Q?, comment TPC8053-H
FET N-Channel 60V 9A; Manufacturer: Toshiba; Package: SO8; EDM-PN: *; Text2: *; Text1: *; Value: TPC8053-H; SAAB PN: *; Part Number: TPC8053-H; DCE Part No: *
footprint SO8 (SOIC, 8-Leads, Body 5.0x4.0mm (max), Pitch 1.27mm, IPC Medium Density)
pins: 1 S, 2 S, 3 S, 4 G, 5 D, 6 D, 7 D, 8 D

## ZVN3310FTA_SOT23
designator Q?, comment ZVN3310FTA
FET N-Channel 100V 100mA; Manufacturer: Diodes Inc; Package: SOT23; EDM-PN: *; Text2: *; Text1: *; Value: ZVN3310FTA; SAAB PN: *; DCE Part No: *; Part Number: ZVN3310FTA
footprint SOT23 (SOT23, 3-Leads, Body 3.0x1.4mm (max), Pitch 0.95mm, IPC Medium Density)
pins: 1 G, 2 S, 3 D

## ZVP0545G_SOT223
designator Q?, comment ZVP0545G
FET P-Channel 450V 75mA; Manufacturer: ST; Package: SOT223; EDM-PN: *; Text2: *; Text1: *; Value: ZVP0545G; SAAB PN: *; Part Number: ZVP0545G; DCE Part No: *
footprint SOT223 (SOT223, 4-Leads, Body 6.7x7.3mm (max), Pitch 2.30mm, IPC Medium Density)
pins: 1 G, 2 D, 3 S, 4 D

## ZVP3310FTA_SOT23
designator Q?, comment ZVP3310FTA
FET P-Channel 100V 75mA; Manufacturer: Diodes Inc; Package: SOT23; EDM-PN: *; Text2: *; Text1: *; Value: ZVP3310FTA; SAAB PN: *; Part Number: ZVP3310FTA; DCE Part No: *
footprint SOT23 (SOT23, 3-Leads, Body 3.0x1.4mm (max), Pitch 0.95mm, IPC Medium Density)
pins: 1 G, 2 S, 3 D

## ZXMP10A17E6_SOT23-6
designator Q?, comment ZXMP10A17E6
FET P-Channel 100V 1.3A; Manufacturer: Diodes Inc; Package: SOT23-6; EDM-PN: *; Text2: *; Text1: *; Value: ZXMP10A17E6; SAAB PN: *; DCE Part No: *; Part Number: ZXMP10A17E6
footprint SOT23-6 (SOT23, 6-Leads, Body 3.0x2.9mm (max), Pitch 0.95mm, IPC Medium Density)
pins: 1 D, 2, 3 G, 4 S, 5, 6

## ZXMS6004FF_SOT23
designator Q?, comment Part Number: ZXMS6004FFTA  (hidden comment: ZXMS6004FF)
FET N-Channel 60V 1.3A; Manufacturer: Zetex; DCE Part No: 8742; EDM-PN: FET197; Value: ZXMS6004FFTA; Package: SOT23; Text2: *; Text1: *; SAAB PN: *
footprint SOT23 (SOT23, 3-Leads, Body 3.0x1.4mm (max), Pitch 0.95mm, IPC Medium Density)
pins: 1 G, 2 S, 3 D

## ZXMS6004FFTA_SOT23
designator Q?, comment ZXMS6004FFTA
FET N-Channel 60V 1.3A; Manufacturer: Zetex; DCE Part No: 8742; EDM-PN: FET197; Package: SOT23; Text2: *; Text1: *; Value: ZXMS6004FFTA; SAAB PN: *; Part Number: ZXMS6004FFTA
footprint SOT23 (SOT23, 3-Leads, Body 3.0x1.4mm (max), Pitch 0.95mm, IPC Medium Density)
pins: 1 G, 2 S, 3 D

## ZXTN25100BFHTA_SOT23
designator Q?, comment ZXTN25100BFHTA
Transistor NPN 100V 3A; Manufacturer: Diodes; Package: SOT23; EDM-PN: *; Text2: *; Text1: *; Part Number: ZXTN25100BFHTA; SAAB PN: *; DCE Part No: *; Value: ZXTN25100BFHTA
footprint SOT23 (SOT23, 3-Leads, Body 3.0x1.4mm (max), Pitch 0.95mm, IPC Medium Density)
pins: 1 B, 2 E, 3 C